# Altium schematic symbol library mastermind.SCHLIB: 732 symbols (part 1 of 5) (continued)
## ATSAM3UxCA-AU (continued)

## ATTINY10
designator IC?, comment ATtiny4/5/9/108-bit Microcontroller with 512/1024 Bytes In-System Programmable Flash
footprint SOT23-6
pins: 1 PB0, 2 GND (power), 3 PB1, 4 PB2, 5 VCC (power), 6 /RST

## ATTINY10-MAHR
designator IC?, comment ATtiny4/5/9/108-bit Microcontroller with 512/1024 Bytes In-System Programmable Flash
footprint UDFN-8
pins: 1 PB1, 4 GND (power), 5 PB0, 6 /RST, 7 VCC (power), 8 PB2

## ATTINY85-20SU
designator U?  (value not drawn)
8KB 2.7V~5.5V AVR 512Byte 20MHz FLASH 6 SOIC-8-208mil Microcontrollers (MCU/MPU/SOC) ROHS; Manufacturer: MICROCHIP(美国微芯); Add into BOM: yes; GPIO Ports Number: 6; ADC (Bit): 10bit; Peripheral/Function: PWM; Watchdog: 有; Symbol: ATTINY85-20SU; Device: ATTINY85-20SU; LCSC Part Name: ATTINY85-20SU; Supplier Part: C89852; Manufacturer Part: ATTINY85-20SU; Supplier Footprint: SOIC-8-208mil; JLCPCB Part Class: Extended Part; Datasheet: https://atta.szlcsc.com/upload/public/pdf/source/20201117/C89852_765368ABD68244126CE6B6218510DF2D.pdf; Supplier: LCSC; Convert to PCB: yes; CPU Core: AVR; Program Storage Size: 8KB; RAM Size: 512Byte; Operating Voltage Range: 2.7V~5.5V; CPU Maximum Speed: 20MHz; Program Memory Type: FLASH; EEPROM: 512Byte; Operating Temperature Range: -40℃~+85℃; DAC (Bit): -; PWM (Bit): -; Universal Serial Bus: -; Internal Comparator: -; communication protocol: -; Real-Time Clock: -; Infrared Data Association: -; Low-Voltage Detect: 有; CCP Capture/Compare: -; Secure Digital Input and Output: -; Direct Memory Access: -; Internal Oscillator: 有
footprint SOIC8_208MIL
pins: 1 PB5 (PCINT5/RESET/ADC0/DW), 2 PB3 (PCINT3/XTAL1/CLKI/OC1B/ADC3), 3 PB4 (PCINT4/XTAL2/CLKO/OC1B/ADC2), 4 GND, 5 PB0 (MOSI/DI/SDA/AIN0/OC0A/OC1A/AREF/PCINT0), 6 PB1 (MISO/DO/AIN1/OC0B/OC1A/PCINT1), 7 PB2 (SCK/USCK/SCL/ADC1/T0/INT0/PCINT2), 8 VCC

## AVRISP-6
designator ISP?, comment AVR ISP HEADER Standard 6 pin header for AVR programming  (value not drawn)
footprint AVRISP
footprint AVRISP - 2mm
pins: 1 MISO, 2 VCC, 3 SCK, 4 MOSI, 5 ~{RST}, 6 GND

## AVRISP-BOX
designator ISP?, comment AVR ISP HEADER Standard 6 pin header for AVR programming  (value not drawn)
footprint AVRISP-BOX
pins: 1 MISO, 2 VCC, 3 SCK, 4 MOSI, 5 ~{RST}, 6 GND

## AXP083-SAG
designator IC?
footprint SOT23
pins: 1 GND (power), 2 /RESET (out), 3 VCC (power)

## B3FS
designator S?, comment DTSM-61-NR
SPNA SMD Keyboard Switch
3D model SPNA (PCB3D Model)
footprint B3FS_SWITCH
pins: 1, 2, 3, 4

## B3P-VH
designator J3  (value not drawn)
Connector Header Through Hole 3 position 0.156" (3.96mm)
footprint JST_B3P-VH(LF)(SN)
pins: 1, 2, 3

## Battery
designator Bat?, comment Bat Holder CR2032
Bat Holder CR2032 SMD; Manufacturer: Comfortable; Manufacturer Part Number: BC-2001; 2nd source part number: 165-0693; Artikkelnr Noca: 55089011; Artikkelnr Simpro: N.A.; Part Number: Bat Holder CR2032 SMD; Datasheet: \\hizz\pro\app9717\Datasheet\connectores\Comfortable\BC-2001.pdf; Footprint Doc: CR2032_HOLDER_SMD; LatestRevisionDate: 2016-04-21; Pin Count: 3; Publisher: Nordic Semiconductor; Published: 2009-12-12; Value: Bat Holder CR2032; Note: Bat Holder CR2032; Supplier: Cabcon; Supplier part number: BC-2001/T & R; 2nd source Supplier: Farnell
footprint CR2032_HOLDER_SMD
pins: +, -

## BC847BPDW1T1G
designator Q?
45V 380mW,5V 100mA NPN+PNP SOT-363 Bipolar (BJT) ROHS; Manufacturer: onsemi(安森美); Add into BOM: yes; DC Current Gain (hFE@Ic,Vce): 200@2mA,5V; Transition Frequency (fT): 100MHz; Collector Cut-Off Current (Icbo): 15nA; Collector-Emitter Saturation Voltage (VCE(sat)@Ic,Ib): 600mV@5mA,100mA; Symbol: BC847BPDW1T1G; Device: BC847BPDW1T1G; Supplier: LCSC; Supplier Part: C232590; Manufacturer Part: BC847BPDW1T1G; JLCPCB Part Class: Extended Part; LCSC Part Name: 耐压:45V 电流:100mA NPN+PNP; Supplier Footprint: SOT-363; Datasheet: https://atta.szlcsc.com/upload/public/pdf/source/20181130/C232590_6CC5AF1A48F235F817BDBD4AE6CDE84D.pdf; Convert to PCB: yes; Transistor Type: NPN+PNP; Operating Temperature: -55℃~+150℃@(Tj)
footprint SOT-363
pins: 1 E, 2 B, 3 C, 4 E, 5 B, 6 C

## BD139
designator Q?
Manufacturer: ST(意法半导体); Add into BOM: yes; DC Current Gain (hFE@Ic,Vce): 40@150mA,2V; Collector Cut-Off Current (Icbo): 100nA; Collector-Emitter Saturation Voltage (VCE(sat)@Ic,Ib): 500mV@50mA,500mA; Symbol: BD139; Device: BD139; LCSC Part Name: 耐压:80V 电流:1.5A NPN; Supplier Part: C27866; Manufacturer Part: BD139; Supplier Footprint: TO-126; JLCPCB Part Class: Extended Part; Datasheet: https://atta.szlcsc.com/upload/public/pdf/source/20141125/1457707249974.pdf; Supplier: LCSC; Convert to PCB: yes
footprint TO-126_L7.5-W2.5-P2.3-B
pins: 1 B, 2 C, 3 E

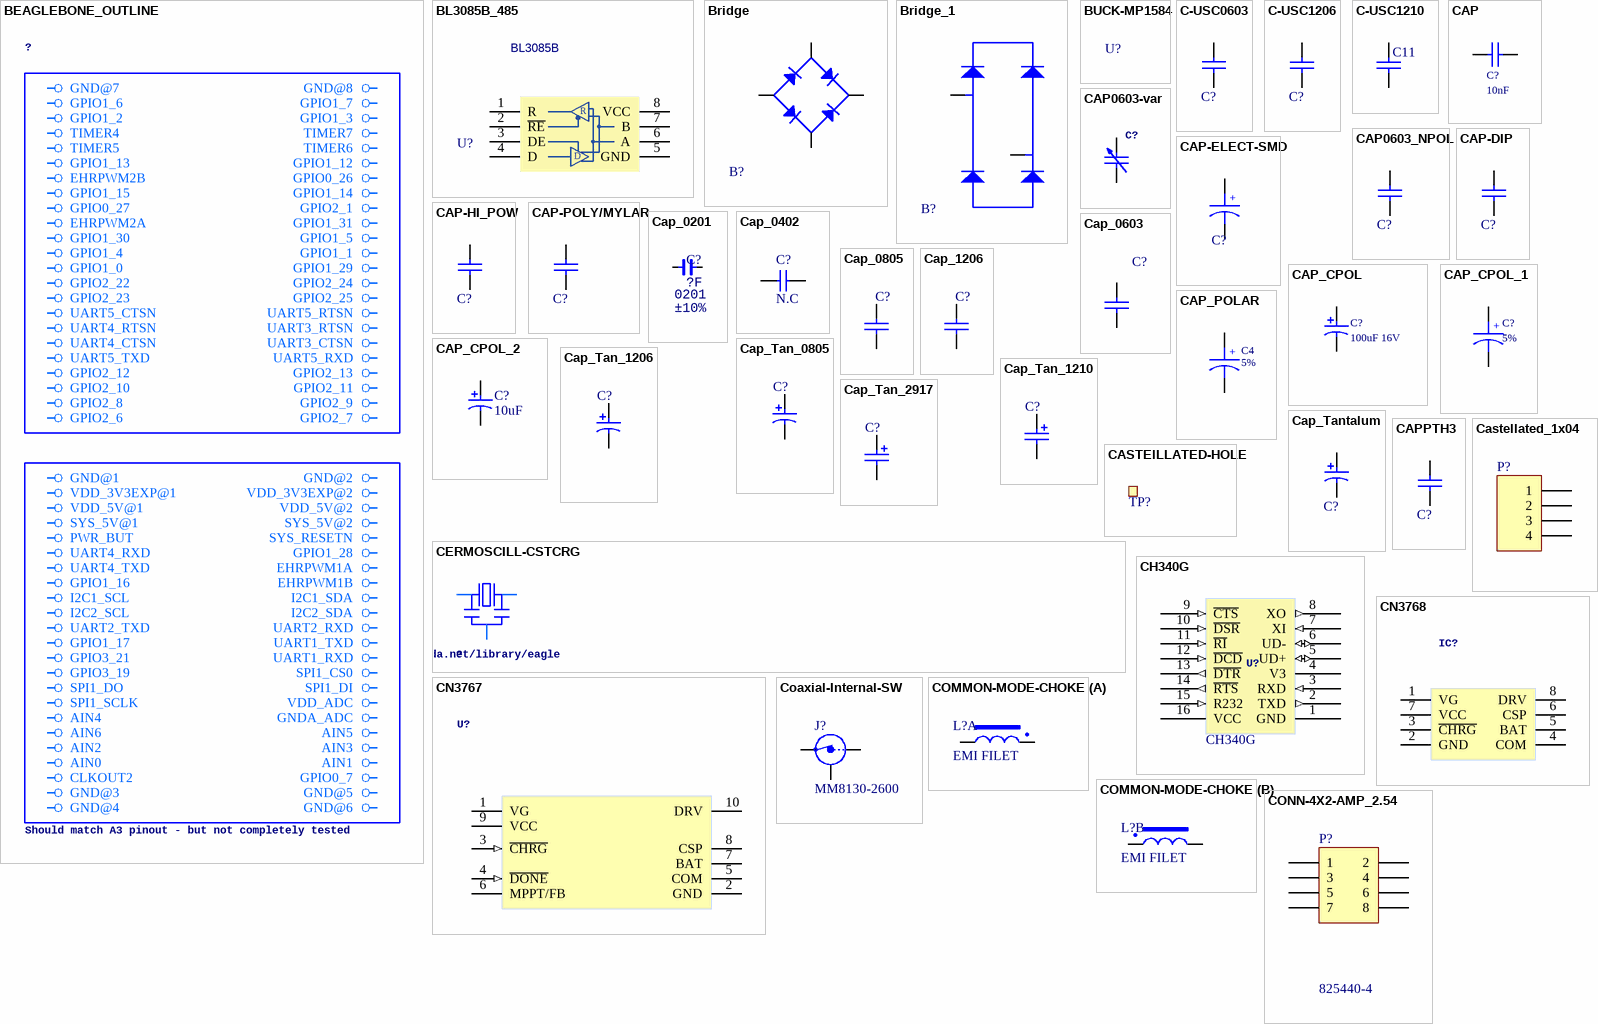
[diagram p7: symbols BEAGLEBONE_OUTLINE to CONN-4X2-AMP_2.54]

## BEAGLEBONE_OUTLINE
designator ?, comment Should match A3 pinout - but not completely tested
footprint BEAGLEBONE_SHIELD
pins: 1 GND@7 (power), 2 GND@8 (power), 3 GPIO1_6, 4 GPIO1_7, 5 GPIO1_2, 6 GPIO1_3, 7 TIMER4, 8 TIMER7, 9 TIMER5, 10 TIMER6, 11 GPIO1_13, 12 GPIO1_12, 13 EHRPWM2B, 14 GPIO0_26, 15 GPIO1_15, 16 GPIO1_14, 17 GPIO0_27, 18 GPIO2_1, 19 EHRPWM2A, 20 GPIO1_31, 21 GPIO1_30, 22 GPIO1_5, 23 GPIO1_4, 24 GPIO1_1, 25 GPIO1_0, 26 GPIO1_29, 27 GPIO2_22, 28 GPIO2_24, 29 GPIO2_23, 30 GPIO2_25, 31 UART5_CTSN, 32 UART5_RTSN, 33 UART4_RTSN, 34 UART3_RTSN, 35 UART4_CTSN, 36 UART3_CTSN, 37 UART5_TXD, 38 UART5_RXD, 39 GPIO2_12, 40 GPIO2_13, 41 GPIO2_10, 42 GPIO2_11, 43 GPIO2_8, 44 GPIO2_9, 45 GPIO2_6, 46 GPIO2_7, 47 GND@1 (power), 48 GND@2 (power), 49 VDD_3V3EXP@1 (power), 50 VDD_3V3EXP@2 (power), 51 VDD_5V@1 (power), 52 VDD_5V@2 (power), 53 SYS_5V@1 (power), 54 SYS_5V@2, 55 PWR_BUT, 56 SYS_RESETN, 57 UART4_RXD, 58 GPIO1_28, 59 UART4_TXD, 60 EHRPWM1A, 61 GPIO1_16, 62 EHRPWM1B, 63 I2C1_SCL, 64 I2C1_SDA, 65 I2C2_SCL, 66 I2C2_SDA, 67 UART2_TXD, 68 UART2_RXD, 69 GPIO1_17, 70 UART1_TXD, 71 GPIO3_21, 72 UART1_RXD, 73 GPIO3_19, 74 SPI1_CS0, 75 SPI1_DO, 76 SPI1_DI, 77 SPI1_SCLK, 78 VDD_ADC, 79 AIN4, 80 GNDA_ADC, 81 AIN6, 82 AIN5, 83 AIN2, 84 AIN3, 85 AIN0 (power), 86 AIN1, 87 CLKOUT2, 88 GPIO0_7, 89 GND@3 (power), 90 GND@5 (power), 91 GND@4 (power), 92 GND@6 (power)

## BL3085B_485
designator U?, comment BL3085B
RS-485/RS-422 ICs ROHS; Manufacturer: BL(上海贝岭); spicePre: X; Manufacturer Part: BL3085B; Supplier: LCSC; Supplier Part: C110791; JLCPCB Part Class: Extended Part; spiceSymbolName: BL3085B
footprint SOIC-8_L4.9-W3.9-P1.27-LS6.0-BL
footprint SOIC-8E (SOIC, 8-Leads, Body 4.90x3.90mm, Pitch 1.27mm, IPC Medium Density)
pins: 1 R, 2 ~{RE}, 3 DE, 4 D, 5 GND (power), 6 A, 7 B (power), 8 VCC (power)

## Bridge
designator B?
footprint MBS
pins: +, -, AC1, AC2

## Bridge_1
designator B?
footprint MBS
pins: +, -, AC1, AC2

## BUCK-MP1584
designator U?

## C-USC0603
designator C?, comment 10%  (value not drawn)
Chip Capacitor
footprint C0603
pins: 1, 2

## C-USC1206
designator C?, comment 10%  (value not drawn)
Chip Capacitor; ComponentLink1Description: New link; ComponentLink1URL: *
footprint C1206
pins: 1, 2

## C-USC1210
designator C11, comment 47u/50V 10%  (value not drawn)
Chip Capacitor
footprint C1210
pins: 1, 2

## CAP
designator C?, comment 10nF
Capacitor; AEMS Code: 2100341
footprint CC1005-0402
footprint CC1608-0603
footprint CC2012-0805
footprint CC3216-1206
footprint CC3225-1210
signal-integrity model Guessed Model (Capacitor Model Details Guessed by Setup Helper)
3D model SMT_0603 (PCB3D Model)
3D model SMT_0805 (PCB3D Model)
footprint C0805
footprint C0603
pins: 1, 2

## CAP0603-var
designator C?, comment CAP0603-Non_Polar  (value not drawn)
footprint C0603
pins: 1, 2

## CAP0603_NPOL
designator C?, comment 10%  (value not drawn)
Chip capacitor
footprint C0603
pins: 1, 2

## CAP-DIP
designator C?, comment N.C  (value not drawn)
Polyester or Mylar capacitor; Value: N.C
footprint dipcap
footprint C-7.68mm
footprint CAP_MYLAR-7.62mm
footprint CAP_MYLAR_7.68mm
footprint MYLAR - 11.6mm
footprint MYLAR - 18mm
footprint mylar - 25MM
footprint MYLAR - 30MM
footprint CAP - 5.08_CERAMIC
pins: 1, 2

## CAP-ELECT-SMD
designator C?, comment uF  (value not drawn)
Smd Aluminum Electrolytic Capacitor; Value: uF
footprint CAP-SMD_BD4.0-L4.3-W4.3-LS5.1-FD
footprint CAP-SMD_BD6.3-L6.6-W6.6-FD-1
footprint CAP-SMD_BD12.5-L13.0-W13.0-LS14.4-FD
footprint CAP-SMD_BD9.5-L10.0-W10.0-LS12.4-FD
footprint CAP-SMD_BD6.3-L6.6-W6.6-FD-1 - TH
footprint CAP-SMD_BD8.0-L8.3-W8.3-FD
pins: 1 +, 2 -

## CAP-HI_POW
designator C?, comment N.C  (value not drawn)
Polyester or Mylar capacitor; Value: N.C
footprint CAP- 56x27mm
footprint CAP- 58x33mm
pins: 1, 2

## CAP-POLY/MYLAR
designator C?, comment N.C  (value not drawn)
Polyester or Mylar capacitor; Value: N.C
footprint dipcap
footprint C-7.68mm
footprint CAP_MYLAR-7.62mm
footprint CAP_MYLAR_7.68mm
footprint MYLAR - 11.6mm
footprint MYLAR - 18mm
footprint mylar - 25MM
footprint MYLAR - 30MM
footprint MYLAR - 15mm
pins: 1, 2

## Cap_0201
designator C?, comment value ?F  Note: ±10%  Type: 0201  (hidden comment: C0201)
Capacitor; Specification: X7R, ±10%, 16V; Manufacturer: *
footprint CAP_0201
pins: 1, 2

## Cap_0402
designator C?, comment N.C
Capacitor, NP0, ±0.1pF; Part Number: C0402-1.2p; Note: 50V; Artikkelnr Noca: 20029157; Artikkelnr Simpro: N.A.; Manufacturer: *; Manufacturer Part Number: *; Datasheet: *; LatestRevisionDate: 2011-05-11; Pin Count: 2; Publisher: Nordic Semiconductor; Published: 2009-05-08; Value: N.C; Supplier: *; Supplier part number: *; 2nd source Supplier: *; 2nd source part number: *; Footprint Doc: 0402
footprint CAPC1005X04L
footprint C0402-NO
footprint C0402
pins: 1, 2

## Cap_0603
designator C?, comment N.C  (value not drawn)
Capacitor, X5R, ±10%, 6.3V; Part Number: C0603-N.C.; Manufacturer: N.A.; Artikkelnr Noca: 20069060; Datasheet: *; LatestRevisionDate: 2009-11-23; Pin Count: 2; Publisher: Nordic Semiconductor; Published: 2009-05-08; Value: N.C; Volts: 6.3V; Supplier: *; Supplier part number: *; 2nd source Supplier: *; 2nd source part number: *; Footprint Doc: 0603; Artikkelnr Simpro: N.A.; Manufacturer Part Number: N.A.
footprint CAPC1608X06L
footprint C0603
footprint C0603-NO
pins: 1, 2

## Cap_0805
designator C?, comment N.C  (value not drawn)
Capacitor, X5R, ±10%, 6.3V; Manufacturer: N.A.; Specification: X7R, ±10%, 16V; Value: N.C
footprint C0805
footprint C0805-NO
pins: 1, 2

## Cap_1206
designator C?, comment N.C  (value not drawn)
Capacitor, X5R, ±10%, 6.3V; Manufacturer: N.A.; Specification: X7R, ±10%, 16V; Value: N.C
footprint C1206-NO
footprint C1206
pins: 1, 2

## CAP_CPOL
designator C?, comment 100uF 16V
Polar Capacitor
footprint MCCT-A (3216 Polar Capacitor)
footprint MCCT-B (3528 Polar Capacitor)
footprint MCCT-C (6032 Polar Capacitor)
footprint MCCT-D (7343 Polar Capacitor)
footprint RB8/3.5
footprint CAPPR2.5-6x7
footprint CAPPR2-5X6.8
3D model Cap5x6_8 (PCB3D Model)
pins: 1, 2

## CAP_CPOL_1
designator C?, comment 5%
Polar Capacitor; AEMS Code: 2100110; Supplier: FARNELL; Supplier Code: 967-117
footprint MCCT-A (3216 Polar Capacitor)
footprint MCCT-B
footprint MCCT-C (6032 Polar Capacitor)
footprint MCCT-D (7343 Polar Capacitor)
3D model MCCTB (PCB3D Model)
pins: 1, 2
text: +

## CAP_CPOL_2
designator C?, comment 10uF
Polar Capacitor; AEMS Code: 2100110; Supplier: FARNELL; Supplier Code: 967-117
footprint MCCT-A (3216 Polar Capacitor)
footprint MCCT-B
footprint MCCT-C (6032 Polar Capacitor)
footprint MCCT-D (7343 Polar Capacitor)
footprint RAD01
3D model SMT_0603 (PCB3D Model)
3D model SMT_0805 (PCB3D Model)
pins: 1, 2

## CAP_POLAR
designator C4, comment 5%
Polar Capacitor; AEMS Code: 2100110; Supplier: FARNELL; Supplier Code: 967-117
footprint MCCT-A (3216 Polar Capacitor)
footprint MCCT-B
footprint MCCT-C (6032 Polar Capacitor)
footprint MCCT-D (7343 Polar Capacitor)
3D model MCCTB (PCB3D Model)
pins: 1, 2
text: +

## Cap_Tan_0805
designator C?, comment C0805  (value not drawn)
Capacitor Tantalum; Specification: X7R, ±10%, 16V; Manufacturer: *
footprint CAP_TAN_P0805
pins: 1, 2
1 alternate drawing of the same symbol

## Cap_Tan_1206
designator C?, comment C1206  (value not drawn)
Capacitor Tantalum; Specification: X7R, ±10%, 16V; Manufacturer: *
footprint CAP_TAN_A1206
pins: 1, 2
1 alternate drawing of the same symbol

## Cap_Tan_1210
designator C?, comment C1210  (value not drawn)
Capacitor Tantalum; Specification: X7R, ±10%, 16V; Manufacturer: *
footprint CAP_TAN_B1210
pins: 1, 2
1 alternate drawing of the same symbol

## Cap_Tan_2917
designator C?, comment C2917  (value not drawn)
Capacitor Tantalum; Specification: X7R, ±10%, 16V; Manufacturer: *
footprint CAP_TAN_D2917
pins: 1, 2
1 alternate drawing of the same symbol

## Cap_Tantalum
designator C?, comment C  10%  (value not drawn)
SMD Tantalum Capacitor
footprint 2917_CAP_taltium
footprint 2412_CAP_taltium
footprint tantalum  A
pins: 1, 2

## CAPPTH3
designator C?
footprint CouplingCap (VARISTOR)
pins: 1, 2

## Castellated_1x04
designator P?  (no BOM)
Header, 4-Pin; LatestRevisionDate: 17-Jul-2002; LatestRevisionNote: Re-released for DXP Platform.; Publisher: Altium Limited
footprint Castellated_1X04
pins: 1, 2, 3, 4

## CASTElLLATED-HOLE
designator TP?, comment TP  (value not drawn)  (no BOM)
V_Cut Hole; Part Number: Testpoint TH; Artikkelnr Noca: N.A.; Manufacturer: *; Manufacturer Part Number: *; Datasheet: *; Footprint Doc: TESTPAD-TH; LatestRevisionDate: 2009-12-12; Pin Count: 1; Publisher: Nordic Semiconductor; Published: 2009-12-12; Value: TP; Note: *; Supplier: *; Supplier part number: *; 2nd source Supplier: *; 2nd source part number: *; Artikkelnr Simpro: N.A.
footprint CastellatedHole_Ø.9mm
footprint CastellatedHole_Ø.6mm
pins: 1

## CERMOSCILL-CSTCRG
designator ?, comment Ceramic oscillator with built in capacitors such as ZTT-12MHz    http://www.ladyada.net/library/eagle
footprint CSTCR-G
pins: 1 IN, 2 GND, 3 OUT

## CH340G
designator U?, comment SymbolName_1: CH340G  (hidden comment: RS232 TRANSCEIVER)
GateName_1: G$1
footprint SO-16
pins: 1 GND, 2 TXD (out), 3 RXD (in), 4 V3, 5 UD+ (io), 6 UD- (io), 7 XI (in), 8 XO (out), 9 ~{CTS} (in), 10 ~{DSR} (in), 11 ~{RI} (in), 12 ~{DCD} (in), 13 ~{DTR} (out), 14 ~{RTS} (out), 15 R232 (in), 16 VCC

## CN3767
designator U?, comment Battey Charger  (value not drawn)
footprint SOIC10 0P600X175-10N
pins: 1 VG, 2 GND, 3 ~{CHRG} (in), 4 ~{DONE} (in), 5 COM (power), 6 MPPT/FB, 7 BAT, 8 CSP (power), 9 VCC, 10 DRV (power)

## CN3768
designator IC?, comment Battey Charger  (value not drawn)
footprint SOP8
pins: 1 VG, 2 GND, 3 ~{CHRG}, 4 COM (power), 5 BAT, 6 CSP (power), 7 VCC, 8 DRV (power)

## Coaxial-Internal-SW
designator J?, comment MM8130-2600
Coaxial Connector with Switch; Manufacturer: Murata; 2nd source part number: 81-MM8130-2600RA2; Artikkelnr Noca: 55029011; Artikkelnr Simpro: N.A.; Part Number: MM8130-2600; Manufacturer Part Number: MM8130-2600; Datasheet: http://www.murata.com/products/catalog/pdf/o33e.pdf; LatestRevisionDate: 2014-04-24; Pin Count: 3; Publisher: Nordic Semiconductor; Published: 2014-04-24; Value: MM8130-2600; Note: *; Supplier: Digi-Key; Supplier part number: 490-4981-1-ND; 2nd source Supplier: Mouser; Footprint Doc: COAXIAL-SWF
footprint COAXIAL-SWF
pins: 1 IN, 2 Shield, 3 OUT

## COMMON-MODE-CHOKE
designator L?, comment EMI FILET
Common Mode Noise Filter
footprint EMI Core
footprint EMI Z0021A
footprint COMMON-IND_30.0
part A pins: 1, 3
part B pins: 2, 4

## CONN-4X2-AMP_2.54
designator P?, comment 825440-4
TE Connectivity AMP Connectors; LatestRevisionDate: 17-Jul-2002; LatestRevisionNote: Re-released for DXP Platform.; Publisher: Altium Limited
signal-integrity model Connector
footprint CONN2X4-AMP (Connector; Header; 5x2 Position)
pins: 1, 2, 3, 4, 5, 6, 7, 8

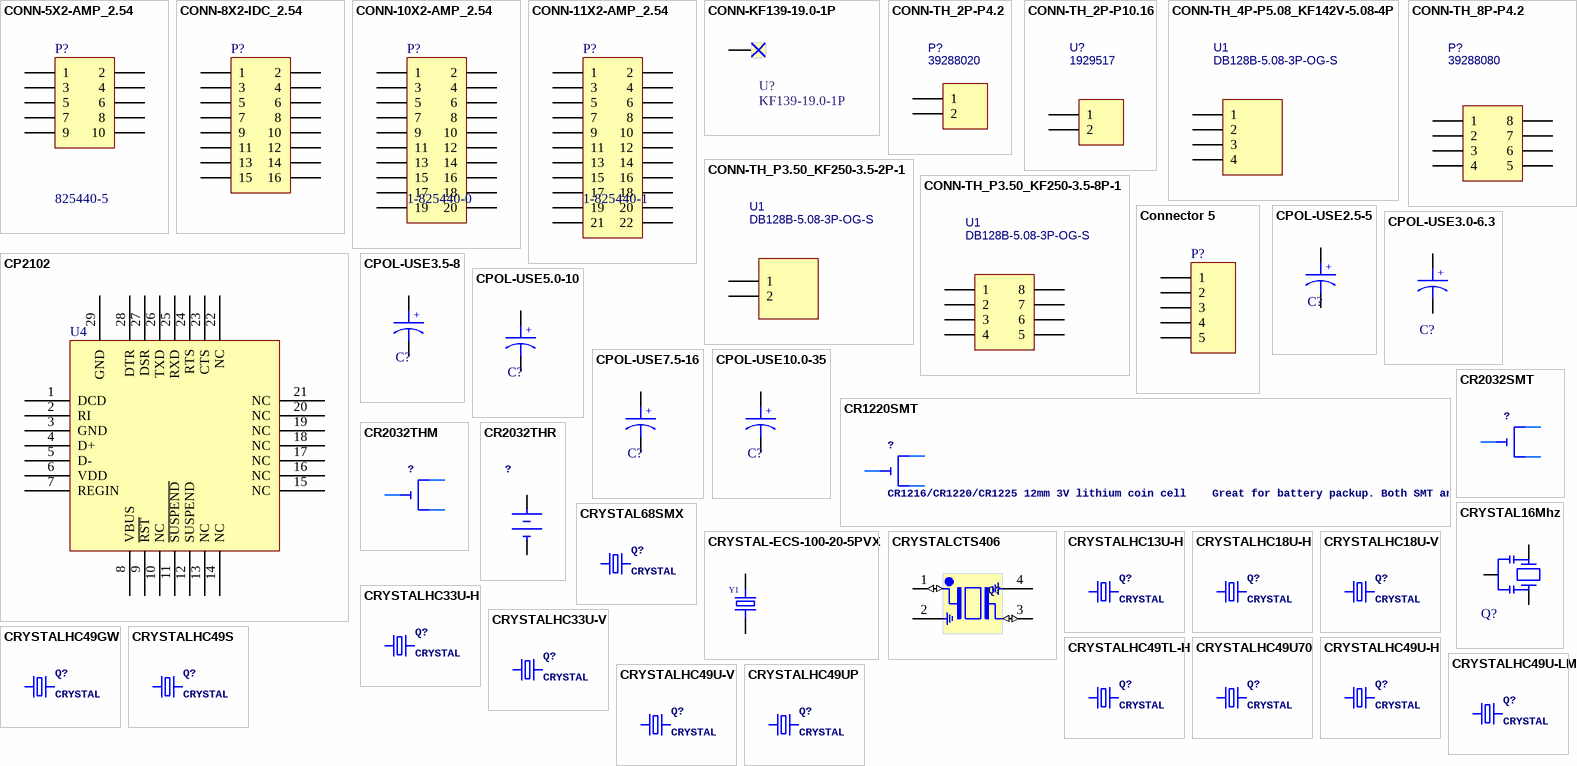
[diagram p8: symbols CONN-5X2-AMP_2.54 to CRYSTALHC49UP]

## CONN-5X2-AMP_2.54
designator P?, comment 825440-5
TE Connectivity AMP Connectors; LatestRevisionDate: 17-Jul-2002; LatestRevisionNote: Re-released for DXP Platform.; Publisher: Altium Limited
signal-integrity model Connector
footprint CONN2X5-AMP (Connector; Header; 5x2 Position)
pins: 1, 2, 3, 4, 5, 6, 7, 8, 9, 10

## CONN-8X2-IDC_2.54
designator P?
IDC Connector; LatestRevisionDate: 17-Jul-2002; LatestRevisionNote: Re-released for DXP Platform.; Publisher: Altium Limited
signal-integrity model Connector
footprint 2X08_SHROUDED
pins: 1, 2, 3, 4, 5, 6, 7, 8, 9, 10, 11, 12, 13, 14, 15, 16

## CONN-10X2-AMP_2.54
designator P?, comment 1-825440-0
TE Connectivity AMP Connectors; LatestRevisionDate: 17-Jul-2002; LatestRevisionNote: Re-released for DXP Platform.; Publisher: Altium Limited
signal-integrity model Connector
footprint CONN2X10-AMP
pins: 1, 2, 3, 4, 5, 6, 7, 8, 9, 10, 11, 12, 13, 14, 15, 16, 17, 18, 19, 20

## CONN-11X2-AMP_2.54
designator P?, comment 1-825440-1
TE Connectivity AMP Connectors; LatestRevisionDate: 17-Jul-2002; LatestRevisionNote: Re-released for DXP Platform.; Publisher: Altium Limited
signal-integrity model Connector
footprint CONN2X11-AMP
pins: 1, 2, 3, 4, 5, 6, 7, 8, 9, 10, 11, 12, 13, 14, 15, 16, 17, 18, 19, 20, 21, 22

## CONN-KF139-19.0-1P
designator U?, comment KF139-19.0-1P
Manufacturer: KEFA(科发); Add into BOM: yes; Symbol: KF139-19.0-1P; Device: KF139-19.0-1P; LCSC Part Name: KF139-19.0-1P; Supplier Part: C6392812; Manufacturer Part: KF139-19.0-1P; Supplier Footprint: 插件; JLCPCB Part Class: Extended Part; Datasheet: https://atta.szlcsc.com/upload/public/pdf/source/20230523/9EEA11B50F6D876494A3C4E93D93D143.pdf; Supplier: LCSC; Convert to PCB: yes
footprint CONN-TH_KF139-19.0-1P
pins: 1

## CONN-TH_2P-P4.2
designator P?, comment 39288020
MOLEX Pow CONN; Contributor: LCSC; Supplier: LCSC; Supplier Part: C490534; Manufacturer: MOLEX; Manufacturer Part: 39288020; JLCPCB Part Class: Extended Part; spicePre: C; spiceSymbolName: 39288020
footprint CONN-TH_39288020
pins: 1, 2

## CONN-TH_2P-P10.16
designator U?, comment 1929517
60A 600V Green Straight 10.16mm 1 2 Plugin,P=10.16mm Screw terminal ROHS; BOM_Manufacturer: DIBO; BOM_Manufacturer Part: DB128B-5.08-3P-OG-S; Contributor: LCSC; BOM_Supplier: LCSC; BOM_Supplier Part: C500034; BOM_JLCPCB Part Class: Extended Part; spicePre: U; spiceSymbolName: DB128B-5.08-3P-OG-S
footprint CONN-TH_KF139-19.0-2P
pins: 1, 2